# Altium footprint library MPBoard.PcbLib: 123 footprints (part 7 of 8)
Each footprint in its own frame and in the unit in brackets; x right, y up, seen from the top. Pads: shape width x height; smd on the part's side, far side on the other; paste and mask are expansions set on the pad; w line width, h text height; cw(c..) or ccw(c..) is an arc to the next point about the centre after c.
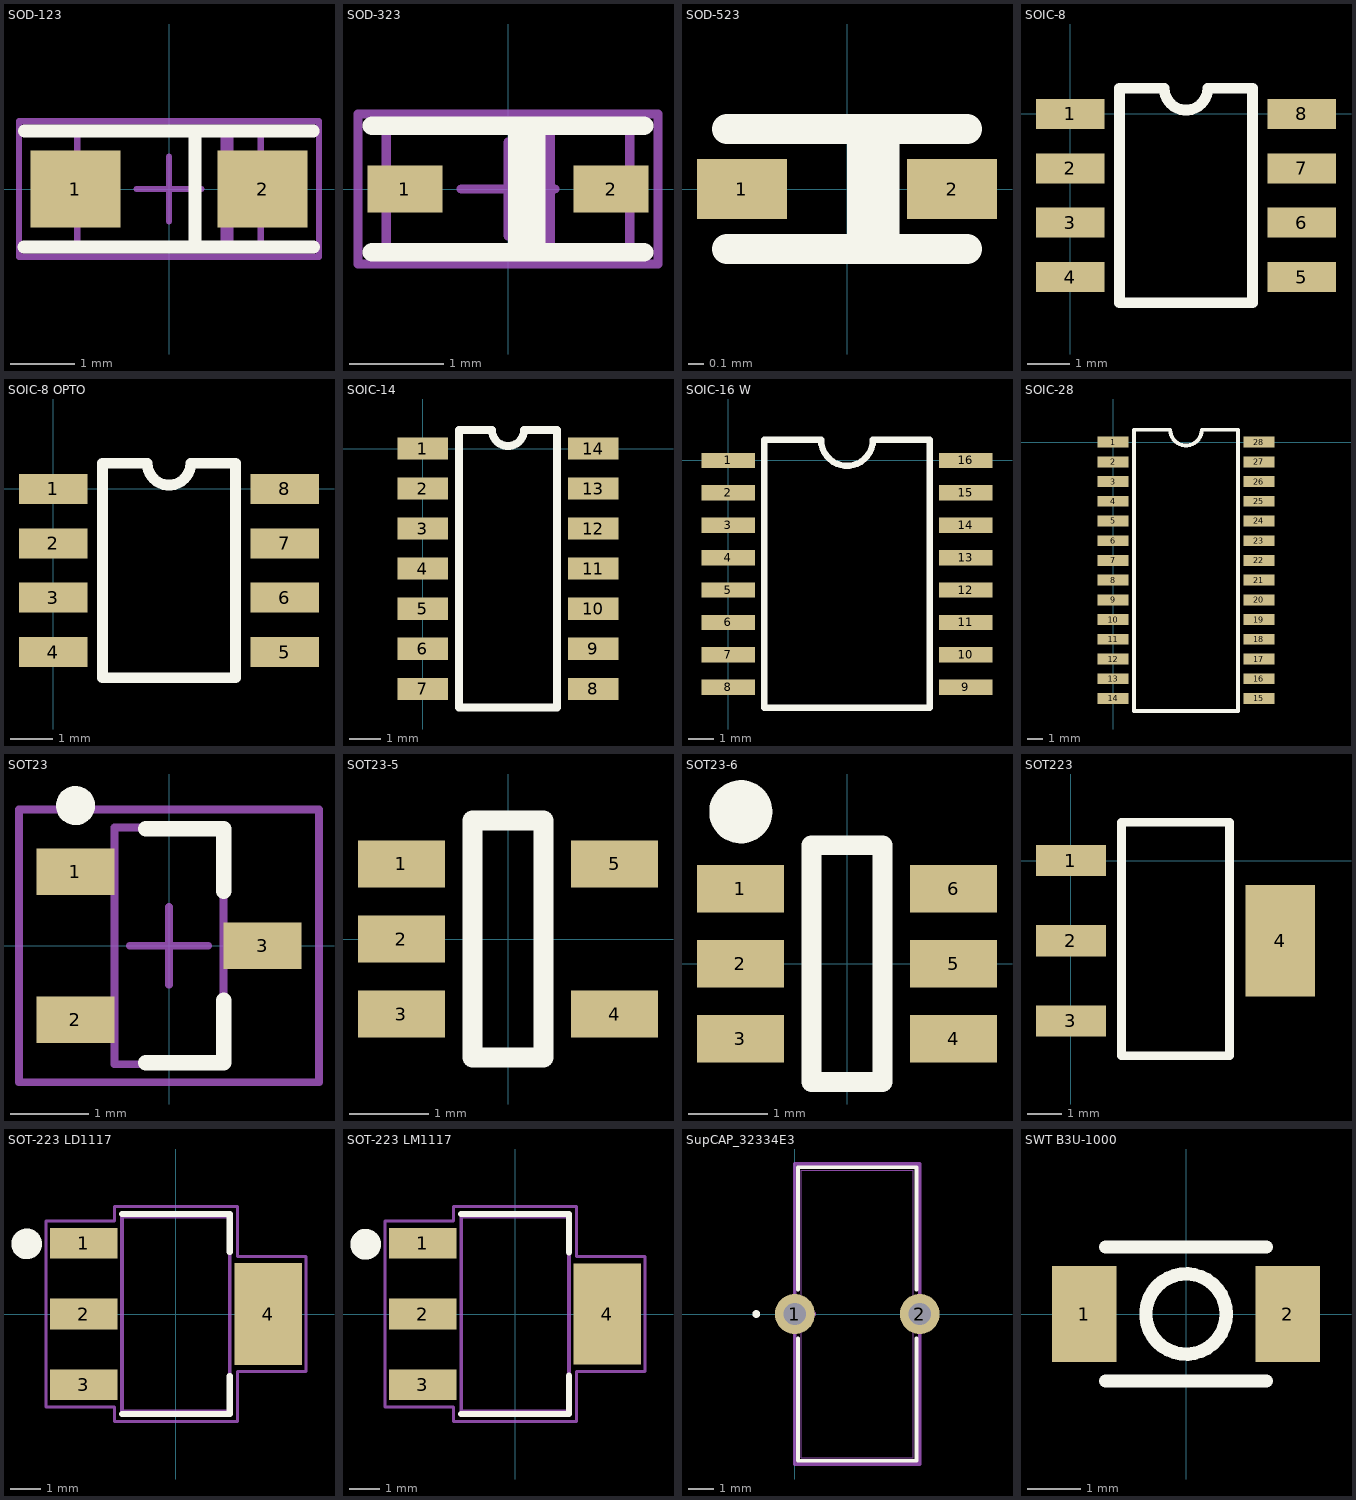
[diagram p6: the footprints below, top view; thin cyan lines are the x and y axes]

## SOD-123 [mm] "SODFL, 2-Leads, Body 1,60x3,75mm, IPC Medium Density"
height 1.17
pads (2):
  rect 1.4x1.2 smd: 1(-1.45,0) 2(1.45,0)
Top Overlay:
  lines w0.2: -2.248,-0.9 2.242,-0.9 ; -2.242,0.9 2.237,0.9 ; 0.4,-0.9 0.4,0.9
Top Component Outline:
  lines w0.1: -1.425,-0.9 1.425,-0.9 1.425,0.9 -1.425,0.9 -1.425,-0.9
  lines w0.2: 0.9,-0.8 0.9,0.8
Top Courtyard:
  lines w0.1: -0.5,0 0.5,0 ; 0,-0.5 0,0.5 ; -2.325,-1.05 2.325,-1.05 2.325,1.05 -2.325,1.05 -2.325,-1.05
3D body "SOD-123.step": height 1.44, standoff -0.01, extent -1.925,-0.85 1.925,0.85

## SOD-323 [mm] "SODFL, 2-Leads, Body 1,60x3,75mm, IPC Medium Density"
height 1.17
pads (2):
  rect 0.8x0.5 smd: 1(-1.1,0) 2(1.1,0)
Top Overlay:
  lines w0.2: -1.45,-0.675 1.45,-0.675 ; -1.45,0.675 1.45,0.675 ; 0.1,-0.675 0.1,0.675 ; 0.3,-0.675 0.3,0.675
Top Component Outline:
  lines w0.1: -1.3,-0.7 1.3,-0.7 1.3,0.7 -1.3,0.7 -1.3,-0.7
  lines w0.2: 0.4,-0.6 0.4,0.6
Top Courtyard:
  lines w0.1: -0.5,0 0.5,0 ; 0,-0.5 0,0.5 ; -1.6,-0.8 1.6,-0.8 1.6,0.8 -1.6,0.8 -1.6,-0.8
3D body "SOD-323.step": height 1.1, standoff 0, extent -1.3,-0.675 1.3,0.675

## SOD-523 [mm] "YB"
pads (2):
  rect 0.6x0.4 smd: 1(-0.7,0) 2(0.7,0)
Top Overlay:
  rectangle: 0,-0.4 0.35,0.4
  lines w0.2: -0.8,-0.4 0.8,-0.4 ; -0.8,0.4 0.8,0.4
3D body "SOD523F.step": height 0.72, standoff 0.02, extent -0.85,-0.45 0.85,0.45

## SOIC-8 [mm] "YB"
pads (8):
  rect 1.6x0.7 smd: 1(0,0) 2(0,-1.27) 3(0,-2.54) 4(0,-3.81) 5(5.4,-3.81) 6(5.4,-2.54) 7(5.4,-1.27) 8(5.4,0)
Top Overlay:
  lines w0.25: 1.15,-4.405 1.15,0.595 2.192,0.595 ccw(c2.7,0.595) 3.208,0.595 4.25,0.595 4.25,-4.405 1.15,-4.405
3D body "soic-8.stp": height 1.75, standoff 0, extent -0.3,-4.375 5.7,0.525

## SOIC-8 OPTO [mm]
pads (8):
  rect 1.6x0.7 smd: 1(0,0) 2(0,-1.27) 3(0,-2.54) 4(0,-3.81) 5(5.4,-3.81) 6(5.4,-2.54) 7(5.4,-1.27) 8(5.4,0)
Top Overlay:
  lines w0.25: 1.15,-4.405 4.25,-4.405 4.25,0.595 3.208,0.595 cw(c2.7,0.595) 2.192,0.595 1.15,0.595 1.15,-4.405
3D body "User Library-SOIC127P610X343-8N.STEP": height 3.48, standoff 0, extent -0.305,-4.842 5.695,0.997

## SOIC-14 [mm] "YB"
pads (14):
  rect 1.6x0.7 smd: 1(0,0) 2(0,-1.27) 3(0,-2.54) 4(0,-3.81) 5(0,-5.08) 6(0,-6.35) 7(0,-7.62) 8(5.4,-7.62) 9(5.4,-6.35) 10(5.4,-5.08) 11(5.4,-3.81) 12(5.4,-2.54) 13(5.4,-1.27) 14(5.4,0)
Top Overlay:
  lines w0.25: 1.15,-8.21 4.25,-8.21 4.25,0.59 3.208,0.59 cw(c2.7,0.59) 2.192,0.59 1.15,0.59 1.15,-8.21
3D body "SOIC-14.STEP": height 1.72, standoff -0.03, extent -0.3,-8.2 5.7,0.55

## SOIC-16 W [mm] "YB"
pads (16):
  rect 2.1x0.6 smd: 1(0,0) 2(0,-1.27) 3(0,-2.54) 4(0,-3.81) 5(0,-5.08) 6(0,-6.35) 7(0,-7.62) 8(0,-8.89) 9(9.3,-8.89) 10(9.3,-7.62) 11(9.3,-6.35) 12(9.3,-5.08) 13(9.3,-3.81) 14(9.3,-2.54) 15(9.3,-1.27) 16(9.3,0)
Top Overlay:
  lines w0.25: 1.4,-9.695 1.4,0.805 3.634,0.805 ccw(c4.65,0.805) 5.666,0.805 7.9,0.805 7.9,-9.695 1.4,-9.695
3D body "SOIC-16W.STEP": height 2.5, standoff 0, extent -0.55,-9.6 9.85,0.7

## SOIC-28 [mm]
pads (28):
  rect 2x0.7 smd: 1(0,0) 2(0,-1.27) 3(0,-2.54) 4(0,-3.81) 5(0,-5.08) 6(0,-6.35) 7(0,-7.62) 8(0,-8.89) 9(0,-10.16) 10(0,-11.43) 11(0,-12.7) 12(0,-13.97) 13(0,-15.24) 14(0,-16.51) 15(9.4,-16.51) 16(9.4,-15.24) 17(9.4,-13.97) 18(9.4,-12.7) 19(9.4,-11.43) 20(9.4,-10.16) 21(9.4,-8.89) 22(9.4,-7.62) 23(9.4,-6.35) 24(9.4,-5.08) 25(9.4,-3.81) 26(9.4,-2.54) 27(9.4,-1.27) 28(9.4,0)
Top Overlay:
  lines w0.25: 1.35,-17.305 1.35,0.795 3.684,0.795 ccw(c4.7,0.795) 5.716,0.795 8.05,0.795 8.05,-17.305 1.35,-17.305
3D body "SOIC-28.step": height 2.73, standoff -0.03, extent -0.4,-17.175 9.9,0.725

## SOT23 [mm] "YB, 3-Leads, Body 3,0x2,6mm (max), Pitch 0,95mm, IPC Medium Density"
height 1.1
pads (3):
  rect 1x0.6 smd: 1(-1.2,0.95) 2(-1.2,-0.95) 3(1.2,0)
Top Overlay:
  circle w0.25: c-1.2,1.8 r0.125
  lines w0.2: -0.3,-1.5 0.7,-1.5 0.7,-0.7 ; -0.3,1.5 0.7,1.5 0.7,0.7
Top Component Outline:
  lines w0.1: -0.7,-1.52 -0.7,1.52 0.7,1.52 0.7,-1.52 -0.7,-1.52
Top Courtyard:
  lines w0.1: -0.5,0 0.5,0 ; 0,-0.5 0,0.5 ; -1.925,-1.75 -1.925,1.75 1.925,1.75 1.925,-1.75 -1.925,-1.75
3D body "SOT95P237X112-3N.step": height 1.12, standoff 0, extent -1.32,-1.52 1.32,1.52

## SOT23-5 [mm] "YB"
pads (5):
  rect 1.1x0.6 smd: 1(-1.35,0.95) 2(-1.35,0) 3(-1.35,-0.95) 4(1.35,-0.95) 5(1.35,0.95)
Top Overlay:
  lines w0.25: -0.45,-1.5 0.45,-1.5 0.45,1.5 -0.45,1.5 -0.45,-1.5
3D body "SOT23-5.STEP": height 1.3, standoff 0, extent -1.4,-1.45 1.4,1.45

## SOT23-6 [mm] "YB"
pads (6):
  rect 1.1x0.6 smd: 1(-1.35,0.95) 2(-1.35,0) 3(-1.35,-0.95) 4(1.35,-0.95) 5(1.35,0) 6(1.35,0.95)
Top Overlay:
  circle w0.4: c-1.345,1.922 r0.2
  lines w0.25: -0.45,-1.5 -0.45,1.5 0.45,1.5 0.45,-1.5 -0.45,-1.5
3D body "SOT23-6.STEP": height 1.43, standoff -0.02, extent -1.4,-1.45 1.4,1.45

## SOT223 [mm] "YB"
pads (4):
  rect 2x0.9 smd: 1(0,0) 2(0,-2.3) 3(0,-4.6)
  rect 2x3.2 smd: 4(6,-2.3)
Top Overlay:
  lines w0.25: 1.45,-5.6 1.45,1.1 4.55,1.1 4.55,-5.6 1.45,-5.6
3D body "SOT223.STEP": height 1.65, standoff 0, extent -0.568,-5.55 6.519,0.95

## SOT-223 LD1117 [mm]
height 1.8
pads (4):
  rect 2.2x1 smd: 1(-3,2.3) 2(-3,0) 3(-3,-2.3)
  rect 2.2x3.3 smd: 4(3,0)
Top Overlay:
  circle w0.5: c-4.851,2.28 r0.25
  lines w0.2: -1.75,-3.25 1.75,-3.25 1.75,-2.01 ; -1.75,3.25 1.75,3.25 1.75,2.01
Top Component Outline:
  lines w0.127: -1.75,-3.175 1.75,-3.175 1.75,3.175 -1.75,3.175 -1.75,-3.175
Top Courtyard:
  lines w0.1: -4.225,-3.025 -2,-3.025 -2,-3.5 2,-3.5 2,-1.875 4.225,-1.875 4.225,1.875 2,1.875 2,3.5 -2,3.5 -2,3.025 -4.225,3.025 -4.225,-3.025
3D body "SOT-223_STM.step": height 1.81, standoff 0, extent -3.645,-3.353 3.645,3.353

## SOT-223 LM1117 [mm]
height 1.8
pads (4):
  rect 2.2x1 smd: 1(-3,2.3) 2(-3,0) 3(-3,-2.3)
  rect 2.2x3.3 smd: 4(3,0)
Top Overlay:
  circle w0.5: c-4.86,2.268 r0.25
  lines w0.2: -1.75,-3.25 1.75,-3.25 1.75,-2.01 ; -1.75,3.25 1.75,3.25 1.75,2.01
Top Component Outline:
  lines w0.127: -1.75,-3.175 -1.75,3.175 1.75,3.175 1.75,-3.175 -1.75,-3.175
Top Courtyard:
  lines w0.1: -4.225,-3.025 -4.225,3.025 -2,3.025 -2,3.5 2,3.5 2,1.875 4.225,1.875 4.225,-1.875 2,-1.875 2,-3.5 -2,-3.5 -2,-3.025 -4.225,-3.025
3D body "step_temp.STEP": height 1.77, standoff -0.03, extent -3.5,-3.25 3.5,3.25

## SupCAP_32334E3 [mm] "VISHAY"
pads (2):
  round 1.6 hole 0.9 paste-0.66 mask+0: 1(0,0) 2(5,0)
Top Overlay:
  circle w0.152: c-1.549,0 r0.076
  lines w0.152: 0.125,-0.985 0.125,-5.88 4.875,-5.88 4.875,-0.985 ; 0.125,0.985 0.125,5.88 4.875,5.88 4.875,0.985
Mechanical 13:
  circle w0: c0.76,0 r0.076
  lines w0.025: 0.252,-5.753 0.252,5.753 4.748,5.753 4.748,-5.753 0.252,-5.753
Mechanical 15:
  lines w0.152: -0.002,-6.007 5.002,-6.007 5.002,6.007 -0.002,6.007 -0.002,-6.007
3D body "CAP_32334E3_VIS.step": height 13.51, standoff -2.22, extent -0.584,-5.753 5.533,5.753

## SWT B3U-1000 [mm]
pads (2):
  rect 1.2x1.8 smd: 1(-1.9,0) 2(1.9,0)
Top Overlay:
  circle w0.25: c0,0 r0.75
  lines w0.25: -1.5,-1.25 1.5,-1.25 ; -1.5,1.25 1.5,1.25
3D body "b3u-1000p.stp": height 1.6, standoff 0, extent -2,-1.25 2,1.25